# Altium footprint library smd-ipc.PCBLIB: 363 footprints (part 19 of 27)
Each footprint in its own frame and in the unit in brackets; x right, y up, seen from the top. Pads: shape width x height; smd on the part's side, far side on the other; paste and mask are expansions set on the pad; w line width, h text height; cw(c..) or ccw(c..) is an arc to the next point about the centre after c.
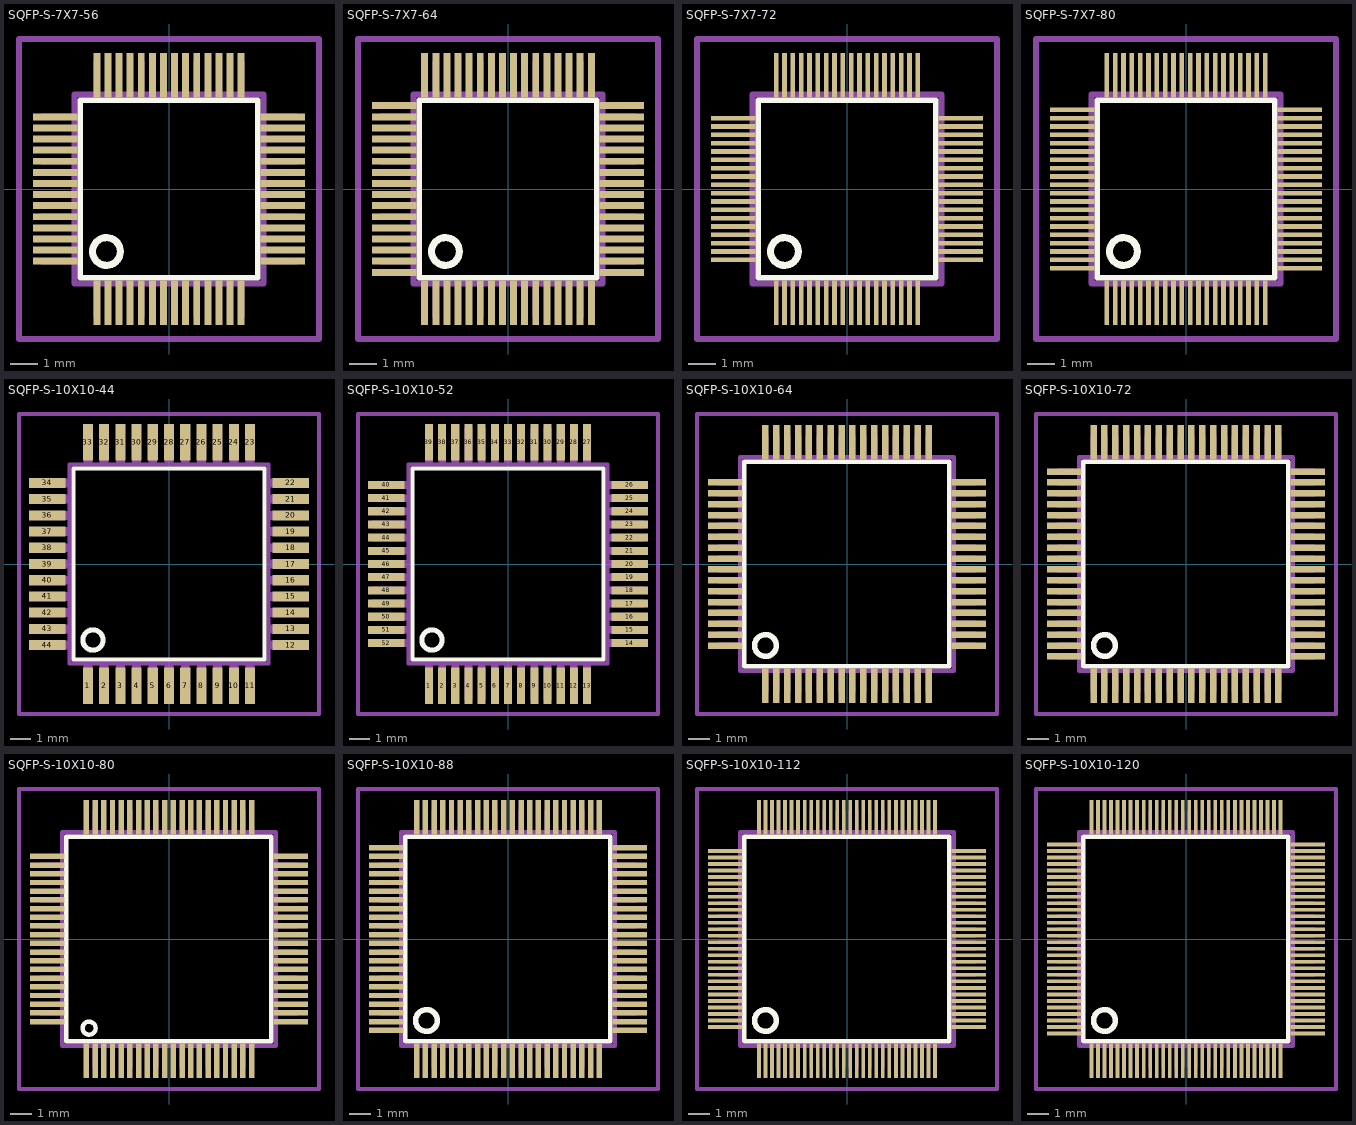
[diagram p18: the footprints below, top view; thin cyan lines are the x and y axes]

## SQFP-S-7X7-56 [mm]
pads (56):
  rect 0.25x1.6 smd: 1(-2.6,-4.1) 2(-2.2,-4.1) 3(-1.8,-4.1) 4(-1.4,-4.1) 5(-1,-4.1) 6(-0.6,-4.1) 7(-0.2,-4.1) 8(0.2,-4.1) 9(0.6,-4.1) 10(1,-4.1) 11(1.4,-4.1) 12(1.8,-4.1) 13(2.2,-4.1) 14(2.6,-4.1) 29(2.6,4.1) 30(2.2,4.1) 31(1.8,4.1) 32(1.4,4.1) 33(1,4.1) 34(0.6,4.1) 35(0.2,4.1) 36(-0.2,4.1) 37(-0.6,4.1) 38(-1,4.1) 39(-1.4,4.1) 40(-1.8,4.1) 41(-2.2,4.1) 42(-2.6,4.1)
  rect 1.6x0.25 smd: 15(4.1,-2.6) 16(4.1,-2.2) 17(4.1,-1.8) 18(4.1,-1.4) 19(4.1,-1) 20(4.1,-0.6) 21(4.1,-0.2) 22(4.1,0.2) 23(4.1,0.6) 24(4.1,1) 25(4.1,1.4) 26(4.1,1.8) 27(4.1,2.2) 28(4.1,2.6) 43(-4.1,2.6) 44(-4.1,2.2) 45(-4.1,1.8) 46(-4.1,1.4) 47(-4.1,1) 48(-4.1,0.6) 49(-4.1,0.2) 50(-4.1,-0.2) 51(-4.1,-0.6) 52(-4.1,-1) 53(-4.1,-1.4) 54(-4.1,-1.8) 55(-4.1,-2.2) 56(-4.1,-2.6)
Top Overlay:
  circle w0.254: c-2.25,-2.25 r0.5
  lines w0.203: -3.2,-3.2 3.2,-3.2 3.2,3.2 -3.2,3.2 -3.2,-3.2
Mechanical 16:
  rectangle: -2.71,-4.6 -2.49,-3.45
  rectangle: -2.31,-4.6 -2.09,-3.45
  rectangle: -1.91,-4.6 -1.69,-3.45
  rectangle: -1.51,-4.6 -1.29,-3.45
  rectangle: -1.11,-4.6 -0.89,-3.45
  rectangle: -0.71,-4.6 -0.49,-3.45
  rectangle: -0.31,-4.6 -0.09,-3.45
  rectangle: 0.09,-4.6 0.31,-3.45
  rectangle: 0.49,-4.6 0.71,-3.45
  rectangle: 0.89,-4.6 1.11,-3.45
  rectangle: 1.29,-4.6 1.51,-3.45
  rectangle: 1.69,-4.6 1.91,-3.45
  rectangle: 2.09,-4.6 2.31,-3.45
  rectangle: 2.49,-4.6 2.71,-3.45
  rectangle: 3.45,-2.71 4.6,-2.49
  rectangle: 3.45,-2.31 4.6,-2.09
  rectangle: 3.45,-1.91 4.6,-1.69
  rectangle: 3.45,-1.51 4.6,-1.29
  rectangle: 3.45,-1.11 4.6,-0.89
  rectangle: 3.45,-0.71 4.6,-0.49
  rectangle: 3.45,-0.31 4.6,-0.09
  rectangle: 3.45,0.09 4.6,0.31
  rectangle: 3.45,0.49 4.6,0.71
  rectangle: 3.45,0.89 4.6,1.11
  rectangle: 3.45,1.29 4.6,1.51
  rectangle: 3.45,1.69 4.6,1.91
  rectangle: 3.45,2.09 4.6,2.31
  rectangle: 3.45,2.49 4.6,2.71
  rectangle: 2.49,3.45 2.71,4.6
  rectangle: 2.09,3.45 2.31,4.6
  rectangle: 1.69,3.45 1.91,4.6
  rectangle: 1.29,3.45 1.51,4.6
  rectangle: 0.89,3.45 1.11,4.6
  rectangle: 0.49,3.45 0.71,4.6
  rectangle: 0.09,3.45 0.31,4.6
  rectangle: -0.31,3.45 -0.09,4.6
  rectangle: -0.71,3.45 -0.49,4.6
  rectangle: -1.11,3.45 -0.89,4.6
  rectangle: -1.51,3.45 -1.29,4.6
  rectangle: -1.91,3.45 -1.69,4.6
  rectangle: -2.31,3.45 -2.09,4.6
  rectangle: -2.71,3.45 -2.49,4.6
  rectangle: -4.6,2.49 -3.45,2.71
  rectangle: -4.6,2.09 -3.45,2.31
  rectangle: -4.6,1.69 -3.45,1.91
  rectangle: -4.6,1.29 -3.45,1.51
  rectangle: -4.6,0.89 -3.45,1.11
  rectangle: -4.6,0.49 -3.45,0.71
  rectangle: -4.6,0.09 -3.45,0.31
  rectangle: -4.6,-0.31 -3.45,-0.09
  rectangle: -4.6,-0.71 -3.45,-0.49
  rectangle: -4.6,-1.11 -3.45,-0.89
  rectangle: -4.6,-1.51 -3.45,-1.29
  rectangle: -4.6,-1.91 -3.45,-1.69
  rectangle: -4.6,-2.31 -3.45,-2.09
  rectangle: -4.6,-2.71 -3.45,-2.49
  lines w0.203: -3.4,-3.4 3.4,-3.4 3.4,3.4 -3.4,3.4 -3.4,-3.4
Mechanical 27:
  lines w0.2: -5.4,-5.4 -5.4,5.4 5.4,5.4 5.4,-5.4 -5.4,-5.4

## SQFP-S-7X7-64 [mm]
pads (64):
  rect 0.25x1.6 smd: 1(-3,-4.1) 2(-2.6,-4.1) 3(-2.2,-4.1) 4(-1.8,-4.1) 5(-1.4,-4.1) 6(-1,-4.1) 7(-0.6,-4.1) 8(-0.2,-4.1) 9(0.2,-4.1) 10(0.6,-4.1) 11(1,-4.1) 12(1.4,-4.1) 13(1.8,-4.1) 14(2.2,-4.1) 15(2.6,-4.1) 16(3,-4.1) 33(3,4.1) 34(2.6,4.1) 35(2.2,4.1) 36(1.8,4.1) 37(1.4,4.1) 38(1,4.1) 39(0.6,4.1) 40(0.2,4.1) 41(-0.2,4.1) 42(-0.6,4.1) 43(-1,4.1) 44(-1.4,4.1) 45(-1.8,4.1) 46(-2.2,4.1) 47(-2.6,4.1) 48(-3,4.1)
  rect 1.6x0.25 smd: 17(4.1,-3) 18(4.1,-2.6) 19(4.1,-2.2) 20(4.1,-1.8) 21(4.1,-1.4) 22(4.1,-1) 23(4.1,-0.6) 24(4.1,-0.2) 25(4.1,0.2) 26(4.1,0.6) 27(4.1,1) 28(4.1,1.4) 29(4.1,1.8) 30(4.1,2.2) 31(4.1,2.6) 32(4.1,3) 49(-4.1,3) 50(-4.1,2.6) 51(-4.1,2.2) 52(-4.1,1.8) 53(-4.1,1.4) 54(-4.1,1) 55(-4.1,0.6) 56(-4.1,0.2) 57(-4.1,-0.2) 58(-4.1,-0.6) 59(-4.1,-1) 60(-4.1,-1.4) 61(-4.1,-1.8) 62(-4.1,-2.2) 63(-4.1,-2.6) 64(-4.1,-3)
Top Overlay:
  circle w0.254: c-2.25,-2.25 r0.5
  lines w0.203: -3.2,-3.2 3.2,-3.2 3.2,3.2 -3.2,3.2 -3.2,-3.2
Mechanical 16:
  rectangle: -3.11,-4.6 -2.89,-3.45
  rectangle: -2.71,-4.6 -2.49,-3.45
  rectangle: -2.31,-4.6 -2.09,-3.45
  rectangle: -1.91,-4.6 -1.69,-3.45
  rectangle: -1.51,-4.6 -1.29,-3.45
  rectangle: -1.11,-4.6 -0.89,-3.45
  rectangle: -0.71,-4.6 -0.49,-3.45
  rectangle: -0.31,-4.6 -0.09,-3.45
  rectangle: 0.09,-4.6 0.31,-3.45
  rectangle: 0.49,-4.6 0.71,-3.45
  rectangle: 0.89,-4.6 1.11,-3.45
  rectangle: 1.29,-4.6 1.51,-3.45
  rectangle: 1.69,-4.6 1.91,-3.45
  rectangle: 2.09,-4.6 2.31,-3.45
  rectangle: 2.49,-4.6 2.71,-3.45
  rectangle: 2.89,-4.6 3.11,-3.45
  rectangle: 3.45,-3.11 4.6,-2.89
  rectangle: 3.45,-2.71 4.6,-2.49
  rectangle: 3.45,-2.31 4.6,-2.09
  rectangle: 3.45,-1.91 4.6,-1.69
  rectangle: 3.45,-1.51 4.6,-1.29
  rectangle: 3.45,-1.11 4.6,-0.89
  rectangle: 3.45,-0.71 4.6,-0.49
  rectangle: 3.45,-0.31 4.6,-0.09
  rectangle: 3.45,0.09 4.6,0.31
  rectangle: 3.45,0.49 4.6,0.71
  rectangle: 3.45,0.89 4.6,1.11
  rectangle: 3.45,1.29 4.6,1.51
  rectangle: 3.45,1.69 4.6,1.91
  rectangle: 3.45,2.09 4.6,2.31
  rectangle: 3.45,2.49 4.6,2.71
  rectangle: 3.45,2.89 4.6,3.11
  rectangle: 2.89,3.45 3.11,4.6
  rectangle: 2.49,3.45 2.71,4.6
  rectangle: 2.09,3.45 2.31,4.6
  rectangle: 1.69,3.45 1.91,4.6
  rectangle: 1.29,3.45 1.51,4.6
  rectangle: 0.89,3.45 1.11,4.6
  rectangle: 0.49,3.45 0.71,4.6
  rectangle: 0.09,3.45 0.31,4.6
  rectangle: -0.31,3.45 -0.09,4.6
  rectangle: -0.71,3.45 -0.49,4.6
  rectangle: -1.11,3.45 -0.89,4.6
  rectangle: -1.51,3.45 -1.29,4.6
  rectangle: -1.91,3.45 -1.69,4.6
  rectangle: -2.31,3.45 -2.09,4.6
  rectangle: -2.71,3.45 -2.49,4.6
  rectangle: -3.11,3.45 -2.89,4.6
  rectangle: -4.6,2.89 -3.45,3.11
  rectangle: -4.6,2.49 -3.45,2.71
  rectangle: -4.6,2.09 -3.45,2.31
  rectangle: -4.6,1.69 -3.45,1.91
  rectangle: -4.6,1.29 -3.45,1.51
  rectangle: -4.6,0.89 -3.45,1.11
  rectangle: -4.6,0.49 -3.45,0.71
  rectangle: -4.6,0.09 -3.45,0.31
  rectangle: -4.6,-0.31 -3.45,-0.09
  rectangle: -4.6,-0.71 -3.45,-0.49
  rectangle: -4.6,-1.11 -3.45,-0.89
  rectangle: -4.6,-1.51 -3.45,-1.29
  rectangle: -4.6,-1.91 -3.45,-1.69
  rectangle: -4.6,-2.31 -3.45,-2.09
  rectangle: -4.6,-2.71 -3.45,-2.49
  rectangle: -4.6,-3.11 -3.45,-2.89
  lines w0.203: -3.4,-3.4 3.4,-3.4 3.4,3.4 -3.4,3.4 -3.4,-3.4
Mechanical 27:
  lines w0.2: -5.4,-5.4 -5.4,5.4 5.4,5.4 5.4,-5.4 -5.4,-5.4

## SQFP-S-7X7-72 [mm]
pads (72):
  rect 0.17x1.6 smd: 1(-2.55,-4.1) 2(-2.25,-4.1) 3(-1.95,-4.1) 4(-1.65,-4.1) 5(-1.35,-4.1) 6(-1.05,-4.1) 7(-0.75,-4.1) 8(-0.45,-4.1) 9(-0.15,-4.1) 10(0.15,-4.1) 11(0.45,-4.1) 12(0.75,-4.1) 13(1.05,-4.1) 14(1.35,-4.1) 15(1.65,-4.1) 16(1.95,-4.1) 17(2.25,-4.1) 18(2.55,-4.1) 37(2.55,4.1) 38(2.25,4.1) 39(1.95,4.1) 40(1.65,4.1) 41(1.35,4.1) 42(1.05,4.1) 43(0.75,4.1) 44(0.45,4.1) 45(0.15,4.1) 46(-0.15,4.1) 47(-0.45,4.1) 48(-0.75,4.1) 49(-1.05,4.1) 50(-1.35,4.1) 51(-1.65,4.1) 52(-1.95,4.1) 53(-2.25,4.1) 54(-2.55,4.1)
  rect 1.6x0.17 smd: 19(4.1,-2.55) 20(4.1,-2.25) 21(4.1,-1.95) 22(4.1,-1.65) 23(4.1,-1.35) 24(4.1,-1.05) 25(4.1,-0.75) 26(4.1,-0.45) 27(4.1,-0.15) 28(4.1,0.15) 29(4.1,0.45) 30(4.1,0.75) 31(4.1,1.05) 32(4.1,1.35) 33(4.1,1.65) 34(4.1,1.95) 35(4.1,2.25) 36(4.1,2.55) 55(-4.1,2.55) 56(-4.1,2.25) 57(-4.1,1.95) 58(-4.1,1.65) 59(-4.1,1.35) 60(-4.1,1.05) 61(-4.1,0.75) 62(-4.1,0.45) 63(-4.1,0.15) 64(-4.1,-0.15) 65(-4.1,-0.45) 66(-4.1,-0.75) 67(-4.1,-1.05) 68(-4.1,-1.35) 69(-4.1,-1.65) 70(-4.1,-1.95) 71(-4.1,-2.25) 72(-4.1,-2.55)
Top Overlay:
  circle w0.254: c-2.25,-2.25 r0.5
  lines w0.203: -3.2,-3.2 3.2,-3.2 3.2,3.2 -3.2,3.2 -3.2,-3.2
Mechanical 16:
  rectangle: -2.62,-4.6 -2.48,-3.45
  rectangle: -2.32,-4.6 -2.18,-3.45
  rectangle: -2.02,-4.6 -1.88,-3.45
  rectangle: -1.72,-4.6 -1.58,-3.45
  rectangle: -1.42,-4.6 -1.28,-3.45
  rectangle: -1.12,-4.6 -0.98,-3.45
  rectangle: -0.82,-4.6 -0.68,-3.45
  rectangle: -0.52,-4.6 -0.38,-3.45
  rectangle: -0.22,-4.6 -0.08,-3.45
  rectangle: 0.08,-4.6 0.22,-3.45
  rectangle: 0.38,-4.6 0.52,-3.45
  rectangle: 0.68,-4.6 0.82,-3.45
  rectangle: 0.98,-4.6 1.12,-3.45
  rectangle: 1.28,-4.6 1.42,-3.45
  rectangle: 1.58,-4.6 1.72,-3.45
  rectangle: 1.88,-4.6 2.02,-3.45
  rectangle: 2.18,-4.6 2.32,-3.45
  rectangle: 2.48,-4.6 2.62,-3.45
  rectangle: 3.45,-2.62 4.6,-2.48
  rectangle: 3.45,-2.32 4.6,-2.18
  rectangle: 3.45,-2.02 4.6,-1.88
  rectangle: 3.45,-1.72 4.6,-1.58
  rectangle: 3.45,-1.42 4.6,-1.28
  rectangle: 3.45,-1.12 4.6,-0.98
  rectangle: 3.45,-0.82 4.6,-0.68
  rectangle: 3.45,-0.52 4.6,-0.38
  rectangle: 3.45,-0.22 4.6,-0.08
  rectangle: 3.45,0.08 4.6,0.22
  rectangle: 3.45,0.38 4.6,0.52
  rectangle: 3.45,0.68 4.6,0.82
  rectangle: 3.45,0.98 4.6,1.12
  rectangle: 3.45,1.28 4.6,1.42
  rectangle: 3.45,1.58 4.6,1.72
  rectangle: 3.45,1.88 4.6,2.02
  rectangle: 3.45,2.18 4.6,2.32
  rectangle: 3.45,2.48 4.6,2.62
  rectangle: 2.48,3.45 2.62,4.6
  rectangle: 2.18,3.45 2.32,4.6
  rectangle: 1.88,3.45 2.02,4.6
  rectangle: 1.58,3.45 1.72,4.6
  rectangle: 1.28,3.45 1.42,4.6
  rectangle: 0.98,3.45 1.12,4.6
  rectangle: 0.68,3.45 0.82,4.6
  rectangle: 0.38,3.45 0.52,4.6
  rectangle: 0.08,3.45 0.22,4.6
  rectangle: -0.22,3.45 -0.08,4.6
  rectangle: -0.52,3.45 -0.38,4.6
  rectangle: -0.82,3.45 -0.68,4.6
  rectangle: -1.12,3.45 -0.98,4.6
  rectangle: -1.42,3.45 -1.28,4.6
  rectangle: -1.72,3.45 -1.58,4.6
  rectangle: -2.02,3.45 -1.88,4.6
  rectangle: -2.32,3.45 -2.18,4.6
  rectangle: -2.62,3.45 -2.48,4.6
  rectangle: -4.6,2.48 -3.45,2.62
  rectangle: -4.6,2.18 -3.45,2.32
  rectangle: -4.6,1.88 -3.45,2.02
  rectangle: -4.6,1.58 -3.45,1.72
  rectangle: -4.6,1.28 -3.45,1.42
  rectangle: -4.6,0.98 -3.45,1.12
  rectangle: -4.6,0.68 -3.45,0.82
  rectangle: -4.6,0.38 -3.45,0.52
  rectangle: -4.6,0.08 -3.45,0.22
  rectangle: -4.6,-0.22 -3.45,-0.08
  rectangle: -4.6,-0.52 -3.45,-0.38
  rectangle: -4.6,-0.82 -3.45,-0.68
  rectangle: -4.6,-1.12 -3.45,-0.98
  rectangle: -4.6,-1.42 -3.45,-1.28
  rectangle: -4.6,-1.72 -3.45,-1.58
  rectangle: -4.6,-2.02 -3.45,-1.88
  rectangle: -4.6,-2.32 -3.45,-2.18
  rectangle: -4.6,-2.62 -3.45,-2.48
  lines w0.203: -3.4,-3.4 3.4,-3.4 3.4,3.4 -3.4,3.4 -3.4,-3.4
Mechanical 27:
  lines w0.2: -5.4,-5.4 -5.4,5.4 5.4,5.4 5.4,-5.4 -5.4,-5.4

## SQFP-S-7X7-80 [mm]
pads (80):
  rect 0.17x1.6 smd: 1(-2.85,-4.1) 2(-2.55,-4.1) 3(-2.25,-4.1) 4(-1.95,-4.1) 5(-1.65,-4.1) 6(-1.35,-4.1) 7(-1.05,-4.1) 8(-0.75,-4.1) 9(-0.45,-4.1) 10(-0.15,-4.1) 11(0.15,-4.1) 12(0.45,-4.1) 13(0.75,-4.1) 14(1.05,-4.1) 15(1.35,-4.1) 16(1.65,-4.1) 17(1.95,-4.1) 18(2.25,-4.1) 19(2.55,-4.1) 20(2.85,-4.1) 41(2.85,4.1) 42(2.55,4.1) 43(2.25,4.1) 44(1.95,4.1) 45(1.65,4.1) 46(1.35,4.1) 47(1.05,4.1) 48(0.75,4.1) 49(0.45,4.1) 50(0.15,4.1) 51(-0.15,4.1) 52(-0.45,4.1) 53(-0.75,4.1) 54(-1.05,4.1) 55(-1.35,4.1) 56(-1.65,4.1) 57(-1.95,4.1) 58(-2.25,4.1) 59(-2.55,4.1) 60(-2.85,4.1)
  rect 1.6x0.17 smd: 21(4.1,-2.85) 22(4.1,-2.55) 23(4.1,-2.25) 24(4.1,-1.95) 25(4.1,-1.65) 26(4.1,-1.35) 27(4.1,-1.05) 28(4.1,-0.75) 29(4.1,-0.45) 30(4.1,-0.15) 31(4.1,0.15) 32(4.1,0.45) 33(4.1,0.75) 34(4.1,1.05) 35(4.1,1.35) 36(4.1,1.65) 37(4.1,1.95) 38(4.1,2.25) 39(4.1,2.55) 40(4.1,2.85) 61(-4.1,2.85) 62(-4.1,2.55) 63(-4.1,2.25) 64(-4.1,1.95) 65(-4.1,1.65) 66(-4.1,1.35) 67(-4.1,1.05) 68(-4.1,0.75) 69(-4.1,0.45) 70(-4.1,0.15) 71(-4.1,-0.15) 72(-4.1,-0.45) 73(-4.1,-0.75) 74(-4.1,-1.05) 75(-4.1,-1.35) 76(-4.1,-1.65) 77(-4.1,-1.95) 78(-4.1,-2.25) 79(-4.1,-2.55) 80(-4.1,-2.85)
Top Overlay:
  circle w0.254: c-2.25,-2.25 r0.5
  lines w0.203: -3.2,-3.2 3.2,-3.2 3.2,3.2 -3.2,3.2 -3.2,-3.2
Mechanical 16:
  rectangle: -2.92,-4.6 -2.78,-3.45
  rectangle: -2.62,-4.6 -2.48,-3.45
  rectangle: -2.32,-4.6 -2.18,-3.45
  rectangle: -2.02,-4.6 -1.88,-3.45
  rectangle: -1.72,-4.6 -1.58,-3.45
  rectangle: -1.42,-4.6 -1.28,-3.45
  rectangle: -1.12,-4.6 -0.98,-3.45
  rectangle: -0.82,-4.6 -0.68,-3.45
  rectangle: -0.52,-4.6 -0.38,-3.45
  rectangle: -0.22,-4.6 -0.08,-3.45
  rectangle: 0.08,-4.6 0.22,-3.45
  rectangle: 0.38,-4.6 0.52,-3.45
  rectangle: 0.68,-4.6 0.82,-3.45
  rectangle: 0.98,-4.6 1.12,-3.45
  rectangle: 1.28,-4.6 1.42,-3.45
  rectangle: 1.58,-4.6 1.72,-3.45
  rectangle: 1.88,-4.6 2.02,-3.45
  rectangle: 2.18,-4.6 2.32,-3.45
  rectangle: 2.48,-4.6 2.62,-3.45
  rectangle: 2.78,-4.6 2.92,-3.45
  rectangle: 3.45,-2.92 4.6,-2.78
  rectangle: 3.45,-2.62 4.6,-2.48
  rectangle: 3.45,-2.32 4.6,-2.18
  rectangle: 3.45,-2.02 4.6,-1.88
  rectangle: 3.45,-1.72 4.6,-1.58
  rectangle: 3.45,-1.42 4.6,-1.28
  rectangle: 3.45,-1.12 4.6,-0.98
  rectangle: 3.45,-0.82 4.6,-0.68
  rectangle: 3.45,-0.52 4.6,-0.38
  rectangle: 3.45,-0.22 4.6,-0.08
  rectangle: 3.45,0.08 4.6,0.22
  rectangle: 3.45,0.38 4.6,0.52
  rectangle: 3.45,0.68 4.6,0.82
  rectangle: 3.45,0.98 4.6,1.12
  rectangle: 3.45,1.28 4.6,1.42
  rectangle: 3.45,1.58 4.6,1.72
  rectangle: 3.45,1.88 4.6,2.02
  rectangle: 3.45,2.18 4.6,2.32
  rectangle: 3.45,2.48 4.6,2.62
  rectangle: 3.45,2.78 4.6,2.92
  rectangle: 2.78,3.45 2.92,4.6
  rectangle: 2.48,3.45 2.62,4.6
  rectangle: 2.18,3.45 2.32,4.6
  rectangle: 1.88,3.45 2.02,4.6
  rectangle: 1.58,3.45 1.72,4.6
  rectangle: 1.28,3.45 1.42,4.6
  rectangle: 0.98,3.45 1.12,4.6
  rectangle: 0.68,3.45 0.82,4.6
  rectangle: 0.38,3.45 0.52,4.6
  rectangle: 0.08,3.45 0.22,4.6
  rectangle: -0.22,3.45 -0.08,4.6
  rectangle: -0.52,3.45 -0.38,4.6
  rectangle: -0.82,3.45 -0.68,4.6
  rectangle: -1.12,3.45 -0.98,4.6
  rectangle: -1.42,3.45 -1.28,4.6
  rectangle: -1.72,3.45 -1.58,4.6
  rectangle: -2.02,3.45 -1.88,4.6
  rectangle: -2.32,3.45 -2.18,4.6
  rectangle: -2.62,3.45 -2.48,4.6
  rectangle: -2.92,3.45 -2.78,4.6
  rectangle: -4.6,2.78 -3.45,2.92
  rectangle: -4.6,2.48 -3.45,2.62
  rectangle: -4.6,2.18 -3.45,2.32
  rectangle: -4.6,1.88 -3.45,2.02
  rectangle: -4.6,1.58 -3.45,1.72
  rectangle: -4.6,1.28 -3.45,1.42
  rectangle: -4.6,0.98 -3.45,1.12
  rectangle: -4.6,0.68 -3.45,0.82
  rectangle: -4.6,0.38 -3.45,0.52
  rectangle: -4.6,0.08 -3.45,0.22
  rectangle: -4.6,-0.22 -3.45,-0.08
  rectangle: -4.6,-0.52 -3.45,-0.38
  rectangle: -4.6,-0.82 -3.45,-0.68
  rectangle: -4.6,-1.12 -3.45,-0.98
  rectangle: -4.6,-1.42 -3.45,-1.28
  rectangle: -4.6,-1.72 -3.45,-1.58
  rectangle: -4.6,-2.02 -3.45,-1.88
  rectangle: -4.6,-2.32 -3.45,-2.18
  rectangle: -4.6,-2.62 -3.45,-2.48
  rectangle: -4.6,-2.92 -3.45,-2.78
  lines w0.203: -3.4,-3.4 3.4,-3.4 3.4,3.4 -3.4,3.4 -3.4,-3.4
Mechanical 27:
  lines w0.2: -5.4,-5.4 -5.4,5.4 5.4,5.4 5.4,-5.4 -5.4,-5.4

## SQFP-S-10X10-44 [mm]
pads (44):
  rect 0.5x1.8 smd: 1(-4,-6) 2(-3.2,-6) 3(-2.4,-6) 4(-1.6,-6) 5(-0.8,-6) 6(0,-6) 7(0.8,-6) 8(1.6,-6) 9(2.4,-6) 10(3.2,-6) 11(4,-6) 23(4,6) 24(3.2,6) 25(2.4,6) 26(1.6,6) 27(0.8,6) 28(0,6) 29(-0.8,6) 30(-1.6,6) 31(-2.4,6) 32(-3.2,6) 33(-4,6)
  rect 1.8x0.5 smd: 12(6,-4) 13(6,-3.2) 14(6,-2.4) 15(6,-1.6) 16(6,-0.8) 17(6,0) 18(6,0.8) 19(6,1.6) 20(6,2.4) 21(6,3.2) 22(6,4) 34(-6,4) 35(-6,3.2) 36(-6,2.4) 37(-6,1.6) 38(-6,0.8) 39(-6,0) 40(-6,-0.8) 41(-6,-1.6) 42(-6,-2.4) 43(-6,-3.2) 44(-6,-4)
Top Overlay:
  circle w0.254: c-3.75,-3.75 r0.5
  lines w0.203: -4.72,-4.71 4.71,-4.71 4.71,4.71 -4.72,4.71 -4.72,-4.71
Mechanical 16:
  rectangle: -4.22,-6.72 -3.78,-4.95
  rectangle: -3.42,-6.72 -2.98,-4.95
  rectangle: -2.62,-6.72 -2.18,-4.95
  rectangle: -1.82,-6.72 -1.38,-4.95
  rectangle: -1.02,-6.72 -0.58,-4.95
  rectangle: -0.22,-6.72 0.22,-4.95
  rectangle: 0.58,-6.72 1.02,-4.95
  rectangle: 1.38,-6.72 1.82,-4.95
  rectangle: 2.18,-6.72 2.62,-4.95
  rectangle: 2.98,-6.72 3.42,-4.95
  rectangle: 3.78,-6.72 4.22,-4.95
  rectangle: 4.95,-4.22 6.72,-3.78
  rectangle: 4.95,-3.42 6.72,-2.98
  rectangle: 4.95,-2.62 6.72,-2.18
  rectangle: 4.95,-1.82 6.72,-1.38
  rectangle: 4.95,-1.02 6.72,-0.58
  rectangle: 4.95,-0.22 6.72,0.22
  rectangle: 4.95,0.58 6.72,1.02
  rectangle: 4.95,1.38 6.72,1.82
  rectangle: 4.95,2.18 6.72,2.62
  rectangle: 4.95,2.98 6.72,3.42
  rectangle: 4.95,3.78 6.72,4.22
  rectangle: 3.78,4.95 4.22,6.72
  rectangle: 2.98,4.95 3.42,6.72
  rectangle: 2.18,4.95 2.62,6.72
  rectangle: 1.38,4.95 1.82,6.72
  rectangle: 0.58,4.95 1.02,6.72
  rectangle: -0.22,4.95 0.22,6.72
  rectangle: -1.02,4.95 -0.58,6.72
  rectangle: -1.82,4.95 -1.38,6.72
  rectangle: -2.62,4.95 -2.18,6.72
  rectangle: -3.42,4.95 -2.98,6.72
  rectangle: -4.22,4.95 -3.78,6.72
  rectangle: -6.72,3.78 -4.95,4.22
  rectangle: -6.72,2.98 -4.95,3.42
  rectangle: -6.72,2.18 -4.95,2.62
  rectangle: -6.72,1.38 -4.95,1.82
  rectangle: -6.72,0.58 -4.95,1.02
  rectangle: -6.72,-0.22 -4.95,0.22
  rectangle: -6.72,-1.02 -4.95,-0.58
  rectangle: -6.72,-1.82 -4.95,-1.38
  rectangle: -6.72,-2.62 -4.95,-2.18
  rectangle: -6.72,-3.42 -4.95,-2.98
  rectangle: -6.72,-4.22 -4.95,-3.78
  lines w0.203: -4.91,-4.91 4.91,-4.91 4.91,4.91 -4.91,4.91 -4.91,-4.91
Mechanical 27:
  lines w0.2: -7.4,-7.4 -7.4,7.4 7.4,7.4 7.4,-7.4 -7.4,-7.4

## SQFP-S-10X10-52 [mm]
pads (52):
  rect 0.4x1.8 smd: 1(-3.9,-6) 2(-3.25,-6) 3(-2.6,-6) 4(-1.95,-6) 5(-1.3,-6) 6(-0.65,-6) 7(0,-6) 8(0.65,-6) 9(1.3,-6) 10(1.95,-6) 11(2.6,-6) 12(3.25,-6) 13(3.9,-6) 27(3.9,6) 28(3.25,6) 29(2.6,6) 30(1.95,6) 31(1.3,6) 32(0.65,6) 33(0,6) 34(-0.65,6) 35(-1.3,6) 36(-1.95,6) 37(-2.6,6) 38(-3.25,6) 39(-3.9,6)
  rect 1.8x0.4 smd: 14(6,-3.9) 15(6,-3.25) 16(6,-2.6) 17(6,-1.95) 18(6,-1.3) 19(6,-0.65) 20(6,0) 21(6,0.65) 22(6,1.3) 23(6,1.95) 24(6,2.6) 25(6,3.25) 26(6,3.9) 40(-6,3.9) 41(-6,3.25) 42(-6,2.6) 43(-6,1.95) 44(-6,1.3) 45(-6,0.65) 46(-6,0) 47(-6,-0.65) 48(-6,-1.3) 49(-6,-1.95) 50(-6,-2.6) 51(-6,-3.25) 52(-6,-3.9)
Top Overlay:
  circle w0.254: c-3.75,-3.75 r0.5
  lines w0.203: -4.72,-4.71 4.71,-4.71 4.71,4.71 -4.72,4.71 -4.72,-4.71
Mechanical 16:
  rectangle: -4.09,-6.72 -3.71,-4.95
  rectangle: -3.44,-6.72 -3.06,-4.95
  rectangle: -2.79,-6.72 -2.41,-4.95
  rectangle: -2.14,-6.72 -1.76,-4.95
  rectangle: -1.49,-6.72 -1.11,-4.95
  rectangle: -0.84,-6.72 -0.46,-4.95
  rectangle: -0.19,-6.72 0.19,-4.95
  rectangle: 0.46,-6.72 0.84,-4.95
  rectangle: 1.11,-6.72 1.49,-4.95
  rectangle: 1.76,-6.72 2.14,-4.95
  rectangle: 2.41,-6.72 2.79,-4.95
  rectangle: 3.06,-6.72 3.44,-4.95
  rectangle: 3.71,-6.72 4.09,-4.95
  rectangle: 4.95,-4.09 6.72,-3.71
  rectangle: 4.95,-3.44 6.72,-3.06
  rectangle: 4.95,-2.79 6.72,-2.41
  rectangle: 4.95,-2.14 6.72,-1.76
  rectangle: 4.95,-1.49 6.72,-1.11
  rectangle: 4.95,-0.84 6.72,-0.46
  rectangle: 4.95,-0.19 6.72,0.19
  rectangle: 4.95,0.46 6.72,0.84
  rectangle: 4.95,1.11 6.72,1.49
  rectangle: 4.95,1.76 6.72,2.14
  rectangle: 4.95,2.41 6.72,2.79
  rectangle: 4.95,3.06 6.72,3.44
  rectangle: 4.95,3.71 6.72,4.09
  rectangle: 3.71,4.95 4.09,6.72
  rectangle: 3.06,4.95 3.44,6.72
  rectangle: 2.41,4.95 2.79,6.72
  rectangle: 1.76,4.95 2.14,6.72
  rectangle: 1.11,4.95 1.49,6.72
  rectangle: 0.46,4.95 0.84,6.72
  rectangle: -0.19,4.95 0.19,6.72
  rectangle: -0.84,4.95 -0.46,6.72
  rectangle: -1.49,4.95 -1.11,6.72
  rectangle: -2.14,4.95 -1.76,6.72
  rectangle: -2.79,4.95 -2.41,6.72
  rectangle: -3.44,4.95 -3.06,6.72
  rectangle: -4.09,4.95 -3.71,6.72
  rectangle: -6.72,3.71 -4.95,4.09
  rectangle: -6.72,3.06 -4.95,3.44
  rectangle: -6.72,2.41 -4.95,2.79
  rectangle: -6.72,1.76 -4.95,2.14
  rectangle: -6.72,1.11 -4.95,1.49
  rectangle: -6.72,0.46 -4.95,0.84
  rectangle: -6.72,-0.19 -4.95,0.19
  rectangle: -6.72,-0.84 -4.95,-0.46
  rectangle: -6.72,-1.49 -4.95,-1.11
  rectangle: -6.72,-2.14 -4.95,-1.76
  rectangle: -6.72,-2.79 -4.95,-2.41
  rectangle: -6.72,-3.44 -4.95,-3.06
  rectangle: -6.72,-4.09 -4.95,-3.71
  lines w0.203: -4.91,-4.91 4.91,-4.91 4.91,4.91 -4.91,4.91 -4.91,-4.91
Mechanical 27:
  lines w0.2: -7.4,-7.4 -7.4,7.4 7.4,7.4 7.4,-7.4 -7.4,-7.4

## SQFP-S-10X10-64 [mm]
pads (64):
  rect 0.3x1.6 smd: 1(-3.75,-5.6) 2(-3.25,-5.6) 3(-2.75,-5.6) 4(-2.25,-5.6) 5(-1.75,-5.6) 6(-1.25,-5.6) 7(-0.75,-5.6) 8(-0.25,-5.6) 9(0.25,-5.6) 10(0.75,-5.6) 11(1.25,-5.6) 12(1.75,-5.6) 13(2.25,-5.6) 14(2.75,-5.6) 15(3.25,-5.6) 16(3.75,-5.6) 33(3.75,5.6) 34(3.25,5.6) 35(2.75,5.6) 36(2.25,5.6) 37(1.75,5.6) 38(1.25,5.6) 39(0.75,5.6) 40(0.25,5.6) 41(-0.25,5.6) 42(-0.75,5.6) 43(-1.25,5.6) 44(-1.75,5.6) 45(-2.25,5.6) 46(-2.75,5.6) 47(-3.25,5.6) 48(-3.75,5.6)
  rect 1.6x0.3 smd: 17(5.6,-3.75) 18(5.6,-3.25) 19(5.6,-2.75) 20(5.6,-2.25) 21(5.6,-1.75) 22(5.6,-1.25) 23(5.6,-0.75) 24(5.6,-0.25) 25(5.6,0.25) 26(5.6,0.75) 27(5.6,1.25) 28(5.6,1.75) 29(5.6,2.25) 30(5.6,2.75) 31(5.6,3.25) 32(5.6,3.75) 49(-5.6,3.75) 50(-5.6,3.25) 51(-5.6,2.75) 52(-5.6,2.25) 53(-5.6,1.75) 54(-5.6,1.25) 55(-5.6,0.75) 56(-5.6,0.25) 57(-5.6,-0.25) 58(-5.6,-0.75) 59(-5.6,-1.25) 60(-5.6,-1.75) 61(-5.6,-2.25) 62(-5.6,-2.75) 63(-5.6,-3.25) 64(-5.6,-3.75)
Top Overlay:
  circle w0.254: c-3.75,-3.75 r0.5
  lines w0.203: -4.72,-4.71 4.71,-4.71 4.71,4.71 -4.72,4.71 -4.72,-4.71
Mechanical 16:
  rectangle: -3.9,-5.9 -3.6,-4.95
  rectangle: -3.4,-5.9 -3.1,-4.95
  rectangle: -2.9,-5.9 -2.6,-4.95
  rectangle: -2.4,-5.9 -2.1,-4.95
  rectangle: -1.9,-5.9 -1.6,-4.95
  rectangle: -1.4,-5.9 -1.1,-4.95
  rectangle: -0.9,-5.9 -0.6,-4.95
  rectangle: -0.4,-5.9 -0.1,-4.95
  rectangle: 0.1,-5.9 0.4,-4.95
  rectangle: 0.6,-5.9 0.9,-4.95
  rectangle: 1.1,-5.9 1.4,-4.95
  rectangle: 1.6,-5.9 1.9,-4.95
  rectangle: 2.1,-5.9 2.4,-4.95
  rectangle: 2.6,-5.9 2.9,-4.95
  rectangle: 3.1,-5.9 3.4,-4.95
  rectangle: 3.6,-5.9 3.9,-4.95
  rectangle: 4.95,-3.9 5.9,-3.6
  rectangle: 4.95,-3.4 5.9,-3.1
  rectangle: 4.95,-2.9 5.9,-2.6
  rectangle: 4.95,-2.4 5.9,-2.1
  rectangle: 4.95,-1.9 5.9,-1.6
  rectangle: 4.95,-1.4 5.9,-1.1
  rectangle: 4.95,-0.9 5.9,-0.6
  rectangle: 4.95,-0.4 5.9,-0.1
  rectangle: 4.95,0.1 5.9,0.4
  rectangle: 4.95,0.6 5.9,0.9
  rectangle: 4.95,1.1 5.9,1.4
  rectangle: 4.95,1.6 5.9,1.9
  rectangle: 4.95,2.1 5.9,2.4
  rectangle: 4.95,2.6 5.9,2.9
  rectangle: 4.95,3.1 5.9,3.4
  rectangle: 4.95,3.6 5.9,3.9
  rectangle: 3.6,4.95 3.9,5.9
  rectangle: 3.1,4.95 3.4,5.9
  rectangle: 2.6,4.95 2.9,5.9
  rectangle: 2.1,4.95 2.4,5.9
  rectangle: 1.6,4.95 1.9,5.9
  rectangle: 1.1,4.95 1.4,5.9
  rectangle: 0.6,4.95 0.9,5.9
  rectangle: 0.1,4.95 0.4,5.9
  rectangle: -0.4,4.95 -0.1,5.9
  rectangle: -0.9,4.95 -0.6,5.9
  rectangle: -1.4,4.95 -1.1,5.9
  rectangle: -1.9,4.95 -1.6,5.9